# Altium footprint library MOLEX THD.PcbLib: 57 footprints (part 3 of 4)
Each footprint in its own frame and in the unit in brackets; x right, y up, seen from the top. Pads: shape width x height; smd on the part's side, far side on the other; paste and mask are expansions set on the pad; w line width, h text height; cw(c..) or ccw(c..) is an arc to the next point about the centre after c.
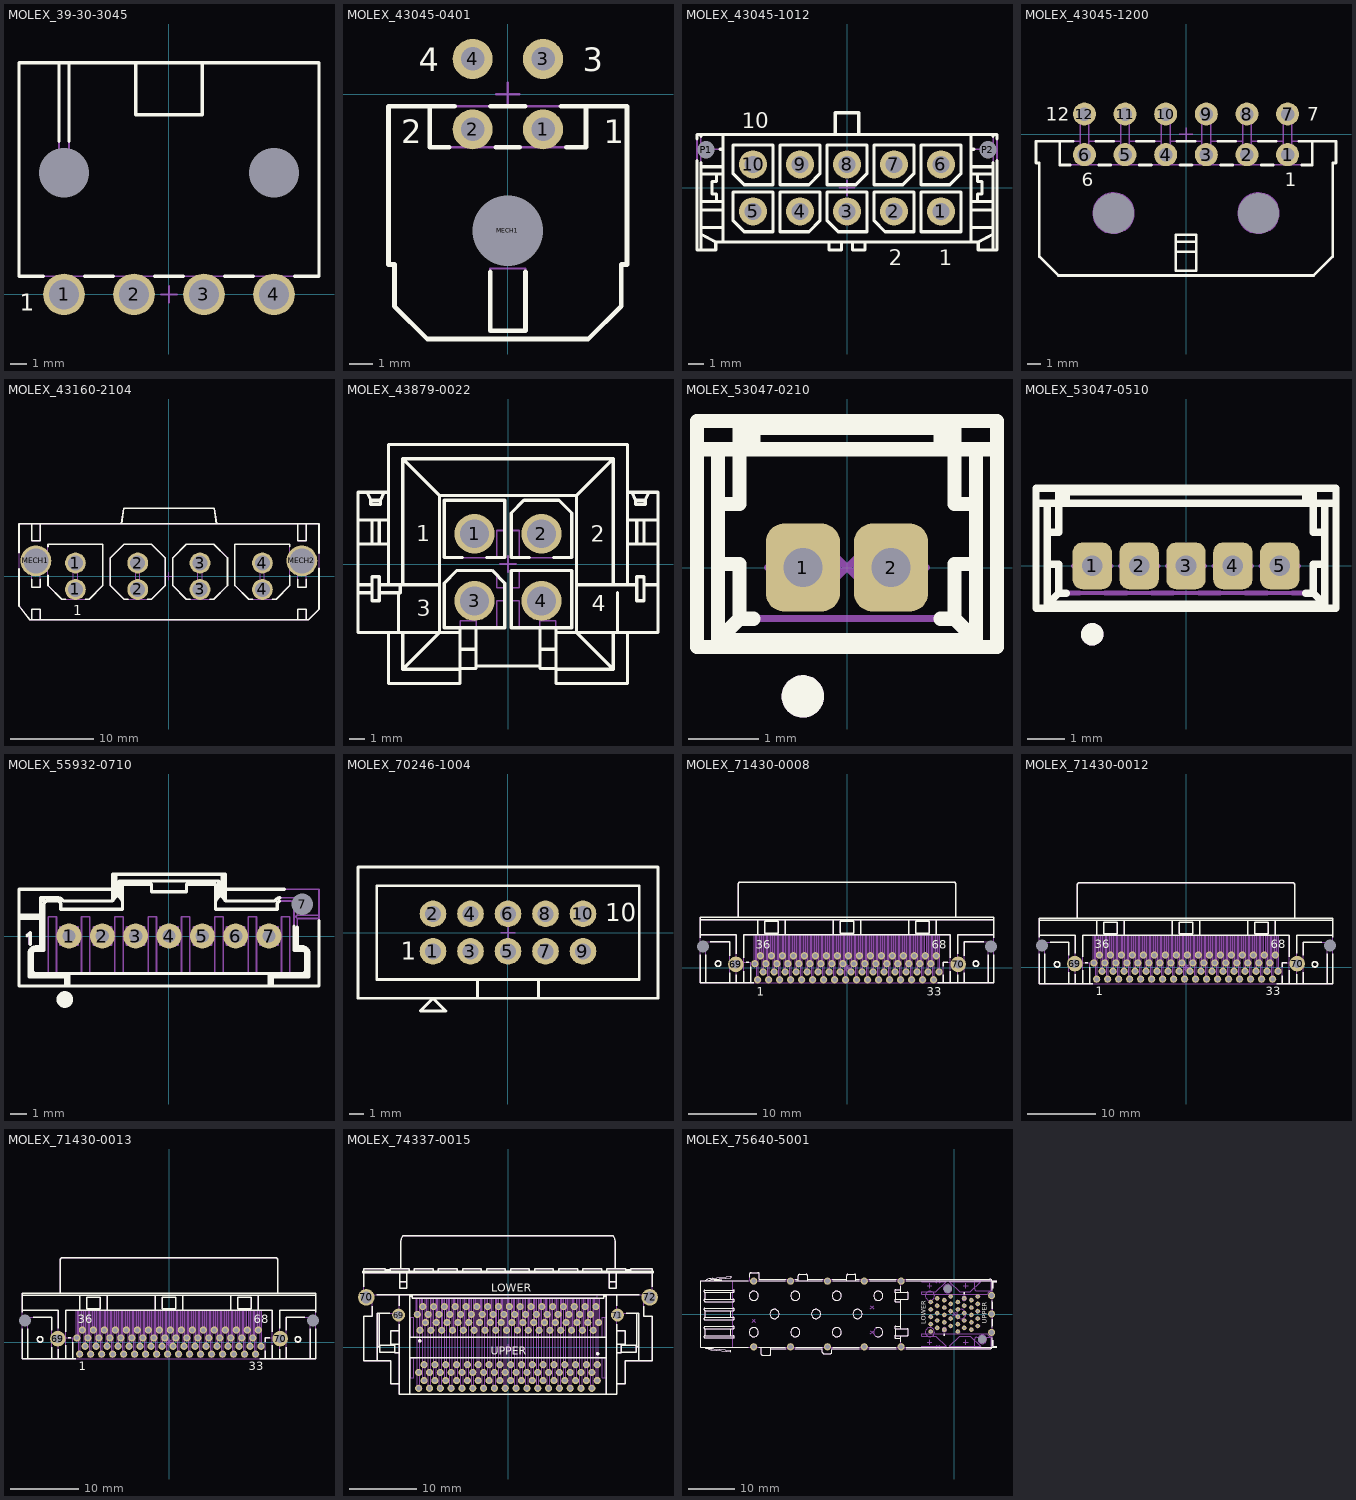
[diagram p2: the footprints below, top view; thin cyan lines are the x and y axes]

## MOLEX_39-30-3045 [mm] "4.20mm (.165\") Pitch Mini-Fit Jr. Header, Single Row, Right Angle, with Snap-in Plastic Peg PCB Lock, 4 Circuits"
height 12.8
pads (6):
  round 2.5 hole 1.8: 1(-6.3,0) 2(-2.1,0) 3(2.1,0) 4(6.3,0)
  round 1 hole 3 unplated mask+1: MECH1(-6.3,7.3) MECH2(6.3,7.3)
Top Overlay:
  lines w0.2: -7.53,1.1 -9,1.1 -9,13.9 9,13.9 9,1.1 7.53,1.1 ; -6.6,9.176 -6.6,13.9 ; -6,9.176 -6,13.9 ; -5.07,1.1 -3.33,1.1 ; -2,13.9 -2,10.778 2,10.778 2,13.9 ; -0.87,1.1 0.87,1.1 ; 3.33,1.1 5.07,1.1
  text "1" at -8.967,-0.968 h1
Mechanical 8:
  lines w0.1: -6.8,0 -6.3,0 ; -6.8,7.3 -6.3,7.3 ; -6.3,-0.5 -6.3,0 ; -6.3,0.5 -6.3,0 ; -6.3,6.8 -6.3,7.3 ; -6.3,7.8 -6.3,7.3 ; -5.8,0 -6.3,0 ; -5.8,7.3 -6.3,7.3 ; -2.6,0 -2.1,0 ; -2.1,-0.5 -2.1,0 ; -2.1,0.5 -2.1,0 ; -1.6,0 -2.1,0 ; -0.5,0 0,0 ; 0,-0.5 0,0 ; 0,0.5 0,0 ; 0.5,0 0,0 ; 1.6,0 2.1,0 ; 2.1,-0.5 2.1,0 ; 2.1,0.5 2.1,0 ; 2.6,0 2.1,0 ; 5.8,0 6.3,0 ; 5.8,7.3 6.3,7.3 ; 6.3,-0.5 6.3,0 ; 6.3,0.5 6.3,0 ; 6.3,6.8 6.3,7.3 ; 6.3,7.8 6.3,7.3 ; 6.8,0 6.3,0 ; 6.8,7.3 6.3,7.3
Mechanical 14:
  lines w0.1: -6.8,1.1 -6.8,-0.5 -5.8,-0.5 -5.8,1.1 ; -6.6,13.9 -6.6,7.6 -6,7.6 -6,13.9 ; -2.6,1.1 -2.6,-0.5 -1.6,-0.5 -1.6,1.1 ; -2,13.9 -2,10.778 2,10.778 2,13.9 ; 1.6,1.1 1.6,-0.5 2.6,-0.5 2.6,1.1 ; 5.8,1.1 5.8,-0.5 6.8,-0.5 6.8,1.1 ; -9,1.1 9,1.1 9,13.9 -9,13.9 -9,1.1
  text "1" at -8.967,-0.968 h1
3D body "MOLEX_39-30-3045.stp": height 7.2, standoff -3.5, extent -9,-0.5 9,13.9

## MOLEX_43045-0401 [mm] "3.00mm (.118\") Pitch Micro-Fit 3.0™ Header, Dual Row, Vertical, with Snap-in Plastic Peg PCB Lock, 4 Circuits"
height 12.8
pads (5):
  round 1.7 hole 1: 1(1.5,-1.5) 2(-1.5,-1.5) 3(1.5,1.5) 4(-1.5,1.5)
  round 1 hole 3 unplated mask+1: MECH1(0,-5.82)
Top Overlay:
  lines w0.2: -3.325,-0.51 -3.325,-2.26 -2.492,-2.26 ; -2.263,-0.51 -5.075,-0.51 -5.075,-7.25 -4.825,-7.25 -4.825,-9.02 -3.425,-10.42 3.425,-10.42 4.825,-9.02 4.825,-7.25 5.075,-7.25 5.075,-0.51 2.263,-0.51 ; -0.75,-7.566 -0.75,-10.07 0.75,-10.07 0.75,-7.566 ; -0.737,-0.51 0.737,-0.51 ; -0.508,-2.26 0.508,-2.26 ; 2.492,-2.26 3.325,-2.26 3.325,-0.51
  text "1" at 4.092,-2.078 h1
  text "3" at 3.192,0.972 h1
  text "4" at -3.783,0.972 h1
  text "2" at -4.533,-2.078 h1
Mechanical 8:
  circle w0.1: c1.5,-1.5 r0.5
  circle w0.1: c1.5,1.5 r0.5
  circle w0.1: c-1.5,1.5 r0.5
  circle w0.1: c-1.5,-1.5 r0.5
  lines w0.1: -2,-1.5 -1.5,-1.5 ; -2,1.5 -1.5,1.5 ; -1.5,-2 -1.5,-1.5 ; -1.5,-1 -1.5,-1.5 ; -1.5,1 -1.5,1.5 ; -1.5,2 -1.5,1.5 ; -1,-1.5 -1.5,-1.5 ; -1,1.5 -1.5,1.5 ; -0.5,-5.82 0,-5.82 ; -0.5,0 0,0 ; 0,-6.32 0,-5.82 ; 0,-5.32 0,-5.82 ; 0,-0.5 0,0 ; 0,0.5 0,0 ; 0.5,-5.82 0,-5.82 ; 0.5,0 0,0 ; 1,-1.5 1.5,-1.5 ; 1,1.5 1.5,1.5 ; 1.5,-2 1.5,-1.5 ; 1.5,-1 1.5,-1.5 ; 1.5,1 1.5,1.5 ; 1.5,2 1.5,1.5 ; 2,-1.5 1.5,-1.5 ; 2,1.5 1.5,1.5
Mechanical 14:
  lines w0.1: -3.325,-0.51 -3.325,-2.26 3.325,-2.26 3.325,-0.51 ; -5.075,-7.25 -5.075,-0.51 5.075,-0.51 5.075,-7.25 4.825,-7.25 4.825,-9.02 3.425,-10.42 -3.425,-10.42 -4.825,-9.02 -4.825,-7.25 -5.075,-7.25 ; -0.75,-10.07 -0.75,-7.42 0.75,-7.42 0.75,-10.07 -0.75,-10.07
  text "1" at 4.092,-2.078 h1
  text "3" at 3.192,0.972 h1
  text "4" at -3.783,0.972 h1
  text "2" at -4.533,-2.078 h1
3D body "MOLEX_43045-0401.stp": height 8.77, standoff -3.18, extent -5.075,-10.42 5.075,1.82

## MOLEX_43045-1012 [mm] "3.00mm (.118\") Pitch Micro-Fit 3.0™ Header, Dual Row, Vertical, with PCB Polarizing Peg, 10 Circuits"
height 9.91
pads (12):
  round 1.8 hole 1.1: 1(6,-1.5) 2(3,-1.5) 3(0,-1.5) 4(-3,-1.5) 5(-6,-1.5) 6(6,1.5) 7(3,1.5) 8(0,1.5) 9(-3,1.5) 10(-6,1.5)
  round 1 hole 1.1 unplated mask+0.05: P1(-9,2.44) P2(9,2.44)
Top Overlay:
  lines w0.2: -9.575,1.748 -9.575,-3.97 -8.375,-3.97 -8.375,-3.46 ; -9.575,3.132 -9.575,3.4 9.575,3.4 9.575,3.132 ; -9.325,-3.97 -9.325,1.601 ; -9.325,-2.96 -8.375,-3.46 ; -9.325,-2.53 -7.925,-2.53 -7.925,-1.405 -9.325,-1.405 ; -9.325,-0.875 -7.925,-0.875 ; -9.325,0.875 -7.925,0.875 ; -9.325,1.345 -7.925,1.345 ; -9.325,3.279 -9.325,3.4 ; -8.325,-0.875 -8.325,-0.4 -8.625,-0.4 -8.625,0.4 -8.325,0.4 -8.325,0.875 ; -8.101,2.47 -7.925,2.47 ; -7.925,-3.46 -7.925,3.4 ; -1.15,-3.46 -1.15,-3.97 -0.35,-3.97 -0.35,-3.46 ; -0.75,3.4 -0.75,4.8 0.75,4.8 0.75,3.4 ; 0.35,-3.46 0.35,-3.97 1.15,-3.97 1.15,-3.46 ; 7.925,-3.46 7.925,3.4 ; 7.925,-2.53 9.325,-2.53 ; 7.925,-1.405 9.325,-1.405 ; 7.925,-0.875 9.325,-0.875 ; 7.925,0.875 9.325,0.875 ; 7.925,1.345 9.325,1.345 ; 7.925,2.47 8.101,2.47 ; 8.325,-0.875 8.325,-0.4 8.625,-0.4 8.625,0.4 8.325,0.4 8.325,0.875 ; 9.325,-3.97 9.325,1.601 ; 9.325,-2.96 8.375,-3.46 ; 9.325,3.279 9.325,3.4 ; 9.575,1.748 9.575,-3.97 8.375,-3.97 8.375,-3.46 ; -8.375,-3.46 8.375,-3.46 ; -7.27,-2.1 -6.57,-2.8 -4.73,-2.8 -4.73,-0.26 -7.27,-0.26 -7.27,-2.1 ; -7.27,0.9 -6.57,0.2 -4.73,0.2 -4.73,2.74 -7.27,2.74 -7.27,0.9 ; -4.27,-2.8 -2.43,-2.8 -1.73,-2.1 -1.73,-0.26 -4.27,-0.26 -4.27,-2.8 ; -4.27,0.2 -2.43,0.2 -1.73,0.9 -1.73,2.74 -4.27,2.74 -4.27,0.2 ; -1.27,-2.1 -0.57,-2.8 1.27,-2.8 1.27,-0.26 -1.27,-0.26 -1.27,-2.1 ; -1.27,0.2 0.57,0.2 1.27,0.9 1.27,2.74 -1.27,2.74 -1.27,0.2 ; 1.73,-2.1 2.43,-2.8 4.27,-2.8 4.27,-0.26 1.73,-0.26 1.73,-2.1 ; 1.73,0.2 3.57,0.2 4.27,0.9 4.27,2.74 1.73,2.74 1.73,0.2 ; 4.73,-2.8 7.27,-2.8 7.27,-0.26 4.73,-0.26 4.73,-2.8 ; 4.73,0.2 4.73,2.74 7.27,2.74 7.27,0.9 6.57,0.2 4.73,0.2
  text "10" at -6.731,3.81 h1
  text "1" at 5.842,-4.953 h1
  text "2" at 2.667,-4.953 h1
Mechanical 8:
  lines w0.1: -9.5,2.44 -9,2.44 ; -9,1.94 -9,2.44 ; -9,2.94 -9,2.44 ; -8.5,2.44 -9,2.44 ; -6.5,-1.5 -6,-1.5 ; -6.5,1.5 -6,1.5 ; -6,-2 -6,-1.5 ; -6,-1 -6,-1.5 ; -6,1 -6,1.5 ; -6,2 -6,1.5 ; -5.5,-1.5 -6,-1.5 ; -5.5,1.5 -6,1.5 ; -3.5,-1.5 -3,-1.5 ; -3.5,1.5 -3,1.5 ; -3,-2 -3,-1.5 ; -3,-1 -3,-1.5 ; -3,1 -3,1.5 ; -3,2 -3,1.5 ; -2.5,-1.5 -3,-1.5 ; -2.5,1.5 -3,1.5 ; -0.5,-1.5 0,-1.5 ; -0.5,0 0,0 ; -0.5,1.5 0,1.5 ; 0,-2 0,-1.5 ; 0,-1 0,-1.5 ; 0,-0.5 0,0 ; 0,0.5 0,0 ; 0,1 0,1.5 ; 0,2 0,1.5 ; 0.5,-1.5 0,-1.5 ; 0.5,0 0,0 ; 0.5,1.5 0,1.5 ; 2.5,-1.5 3,-1.5 ; 2.5,1.5 3,1.5 ; 3,-2 3,-1.5 ; 3,-1 3,-1.5 ; 3,1 3,1.5 ; 3,2 3,1.5 ; 3.5,-1.5 3,-1.5 ; 3.5,1.5 3,1.5 ; 5.5,-1.5 6,-1.5 ; 5.5,1.5 6,1.5 ; 6,-2 6,-1.5 ; 6,-1 6,-1.5 ; 6,1 6,1.5 ; 6,2 6,1.5 ; 6.5,-1.5 6,-1.5 ; 6.5,1.5 6,1.5 ; 8.5,2.44 9,2.44 ; 9,1.94 9,2.44 ; 9,2.94 9,2.44 ; 9.5,2.44 9,2.44
Mechanical 14:
  lines w0.1: -9.325,-3.97 -9.325,3.4 ; -9.325,-2.96 -8.375,-3.46 ; -9.325,-2.53 -7.925,-2.53 -7.925,-1.405 -9.325,-1.405 ; -9.325,-0.875 -7.925,-0.875 ; -9.325,0.875 -7.925,0.875 ; -9.325,1.345 -7.925,1.345 ; -9.325,2.47 -7.925,2.47 ; -8.325,-0.875 -8.325,-0.4 -8.625,-0.4 -8.625,0.4 -8.325,0.4 -8.325,0.875 ; -7.925,-3.46 -7.925,3.4 ; -1.15,-3.46 -1.15,-3.97 -0.35,-3.97 -0.35,-3.46 ; -0.75,3.4 -0.75,4.8 0.75,4.8 0.75,3.4 ; 0.35,-3.46 0.35,-3.97 1.15,-3.97 1.15,-3.46 ; 7.925,-3.46 7.925,3.4 ; 7.925,-2.53 9.325,-2.53 ; 7.925,-1.405 9.325,-1.405 ; 7.925,-0.875 9.325,-0.875 ; 7.925,0.875 9.325,0.875 ; 7.925,1.345 9.325,1.345 ; 7.925,2.47 9.325,2.47 ; 8.325,-0.875 8.325,-0.4 8.625,-0.4 8.625,0.4 8.325,0.4 8.325,0.875 ; 9.325,-3.97 9.325,3.4 ; 9.325,-2.96 8.375,-3.46 ; -8.375,-3.46 -8.375,-3.97 -9.575,-3.97 -9.575,3.4 9.575,3.4 9.575,-3.97 8.375,-3.97 8.375,-3.46 ; -8.375,-3.46 8.375,-3.46 ; -7.27,-2.1 -7.27,-0.26 -4.73,-0.26 -4.73,-2.8 -6.57,-2.8 -7.27,-2.1 ; -7.27,0.9 -7.27,2.74 -4.73,2.74 -4.73,0.2 -6.57,0.2 -7.27,0.9 ; -4.27,-2.8 -4.27,-0.26 -1.73,-0.26 -1.73,-2.1 -2.43,-2.8 -4.27,-2.8 ; -4.27,0.2 -4.27,2.74 -1.73,2.74 -1.73,0.9 -2.43,0.2 -4.27,0.2 ; -1.27,-2.1 -1.27,-0.26 1.27,-0.26 1.27,-2.8 -0.57,-2.8 -1.27,-2.1 ; -1.27,0.2 -1.27,2.74 1.27,2.74 1.27,0.9 0.57,0.2 -1.27,0.2 ; 1.73,-2.1 1.73,-0.26 4.27,-0.26 4.27,-2.8 2.43,-2.8 1.73,-2.1 ; 1.73,0.2 1.73,2.74 4.27,2.74 4.27,0.9 3.57,0.2 1.73,0.2 ; 4.73,-2.8 4.73,-0.26 7.27,-0.26 7.27,-2.8 4.73,-2.8 ; 4.73,0.2 6.57,0.2 7.27,0.9 7.27,2.74 4.73,2.74 4.73,0.2
  text "1" at 5.842,-4.953 h1
  text "10" at -6.731,3.81 h1
  text "2" at 2.667,-4.953 h1
3D body "MOLEX_43045-1012.stp": height 9.91, standoff -3.18, extent -9.575,-3.97 9.575,4.8

## MOLEX_43045-1200 [mm] "3.00mm (.118\") Pitch Micro-Fit 3.0™, Dual Row Righ Angled Header, with PCB Polarizing Peg, 12 Circuits"
height 8.77
pads (14):
  round 1.7 hole 1: 1(7.5,-1.5) 2(4.5,-1.5) 3(1.5,-1.5) 4(-1.5,-1.5) 5(-4.5,-1.5) 6(-7.5,-1.5) 7(7.5,1.5) 8(4.5,1.5) 9(1.5,1.5) 10(-1.5,1.5) 11(-4.5,1.5) 12(-7.5,1.5)
  round 1 hole 3 unplated mask+1: MECH1(-5.35,-5.82) MECH2(5.35,-5.82)
Top Overlay:
  lines w0.2: -9.325,-0.51 -9.325,-2.26 -8.555,-2.26 ; -8.343,-0.51 -11.075,-0.51 -11.075,-2.11 -10.825,-2.11 -10.825,-9.02 -9.425,-10.42 9.425,-10.42 10.825,-9.02 10.825,-2.11 11.075,-2.11 11.075,-0.51 8.343,-0.51 ; -6.657,-0.51 -5.343,-0.51 ; -6.445,-2.26 -5.555,-2.26 ; -3.657,-0.51 -2.343,-0.51 ; -3.445,-2.26 -2.555,-2.26 ; -0.75,-8.67 0.75,-8.67 ; -0.75,-7.92 0.75,-7.92 ; -0.657,-0.51 0.657,-0.51 ; -0.445,-2.26 0.445,-2.26 ; 2.343,-0.51 3.657,-0.51 ; 2.555,-2.26 3.445,-2.26 ; 5.343,-0.51 6.657,-0.51 ; 5.555,-2.26 6.445,-2.26 ; 8.555,-2.26 9.325,-2.26 9.325,-0.51 ; -0.75,-10.07 0.75,-10.07 0.75,-7.42 -0.75,-7.42 -0.75,-10.07
  text "1" at 7.292,-3.828 h1
  text "7" at 8.942,1.022 h1
  text "12" at -10.358,1.022 h1
  text "6" at -7.708,-3.828 h1
Mechanical 8:
  circle w0.1: c-5.35,-5.82 r1.5
  circle w0.1: c5.35,-5.82 r1.5
  lines w0.1: -8,-1.5 -7.5,-1.5 ; -8,1.5 -7.5,1.5 ; -7.5,-2 -7.5,-1.5 ; -7.5,-1 -7.5,-1.5 ; -7.5,1 -7.5,1.5 ; -7.5,2 -7.5,1.5 ; -7,-1.5 -7.5,-1.5 ; -7,1.5 -7.5,1.5 ; -5.85,-5.82 -5.35,-5.82 ; -5.35,-6.32 -5.35,-5.82 ; -5.35,-5.32 -5.35,-5.82 ; -5,-1.5 -4.5,-1.5 ; -5,1.5 -4.5,1.5 ; -4.85,-5.82 -5.35,-5.82 ; -4.5,-2 -4.5,-1.5 ; -4.5,-1 -4.5,-1.5 ; -4.5,1 -4.5,1.5 ; -4.5,2 -4.5,1.5 ; -4,-1.5 -4.5,-1.5 ; -4,1.5 -4.5,1.5 ; -2,-1.5 -1.5,-1.5 ; -2,1.5 -1.5,1.5 ; -1.5,-2 -1.5,-1.5 ; -1.5,-1 -1.5,-1.5 ; -1.5,1 -1.5,1.5 ; -1.5,2 -1.5,1.5 ; -1,-1.5 -1.5,-1.5 ; -1,1.5 -1.5,1.5 ; -0.5,0 0,0 ; 0,-0.5 0,0 ; 0,0.5 0,0 ; 0.5,0 0,0 ; 1,-1.5 1.5,-1.5 ; 1,1.5 1.5,1.5 ; 1.5,-2 1.5,-1.5 ; 1.5,-1 1.5,-1.5 ; 1.5,1 1.5,1.5 ; 1.5,2 1.5,1.5 ; 2,-1.5 1.5,-1.5 ; 2,1.5 1.5,1.5 ; 4,-1.5 4.5,-1.5 ; 4,1.5 4.5,1.5 ; 4.5,-2 4.5,-1.5 ; 4.5,-1 4.5,-1.5 ; 4.5,1 4.5,1.5 ; 4.5,2 4.5,1.5 ; 4.85,-5.82 5.35,-5.82 ; 5,-1.5 4.5,-1.5 ; 5,1.5 4.5,1.5 ; 5.35,-6.32 5.35,-5.82 ; 5.35,-5.32 5.35,-5.82 ; 5.85,-5.82 5.35,-5.82 ; 7,-1.5 7.5,-1.5 ; 7,1.5 7.5,1.5 ; 7.5,-2 7.5,-1.5 ; 7.5,-1 7.5,-1.5 ; 7.5,1 7.5,1.5 ; 7.5,2 7.5,1.5 ; 8,-1.5 7.5,-1.5 ; 8,1.5 7.5,1.5
Mechanical 14:
  lines w0.1: -9.325,-0.51 -9.325,-2.26 9.325,-2.26 9.325,-0.51 ; -7.82,-0.51 -11.075,-0.51 -11.075,-2.11 -10.825,-2.11 -10.825,-9.02 -9.425,-10.42 9.425,-10.42 10.825,-9.02 10.825,-2.11 11.075,-2.11 11.075,-0.51 7.82,-0.51 ; -7.18,-0.51 -4.82,-0.51 ; -4.18,-0.51 -1.82,-0.51 ; -1.18,-0.51 1.18,-0.51 ; -0.75,-8.67 0.75,-8.67 ; -0.75,-7.92 0.75,-7.92 ; 1.82,-0.51 4.18,-0.51 ; 4.82,-0.51 7.18,-0.51 ; -7.82,-1.82 -7.82,1.82 -7.18,1.82 -7.18,-1.82 -7.82,-1.82 ; -4.82,-1.82 -4.82,1.82 -4.18,1.82 -4.18,-1.82 -4.82,-1.82 ; -1.82,-1.82 -1.82,1.82 -1.18,1.82 -1.18,-1.82 -1.82,-1.82 ; -0.75,-10.07 0.75,-10.07 0.75,-7.42 -0.75,-7.42 -0.75,-10.07 ; 1.18,-1.82 1.18,1.82 1.82,1.82 1.82,-1.82 1.18,-1.82 ; 4.18,-1.82 4.18,1.82 4.82,1.82 4.82,-1.82 4.18,-1.82 ; 7.18,-1.82 7.18,1.82 7.82,1.82 7.82,-1.82 7.18,-1.82
  text "1" at 7.292,-3.828 h1
  text "7" at 8.942,1.022 h1
  text "12" at -10.358,1.022 h1
  text "6" at -7.708,-3.828 h1
3D body "MOLEX_43045-1200.stp": height 8.77, standoff -3.18, extent -11.075,-10.42 11.075,1.82

## MOLEX_43160-2104 [mm] "7.50mm Pitch  4 Circuits Sabre™ Vertical Header  (Glow Wire Compatible) with Board Lock"
height 14.86
pads (10):
  round 2.5 hole 1.8: 1(-11.24,-1.59) 1(-11.24,1.59) 2(-3.747,-1.59) 2(-3.747,1.59) 3(3.747,-1.59) 3(3.747,1.59) 4(11.24,-1.59) 4(11.24,1.59)
  round 3.7 hole 3: MECH1(-15.989,1.844) MECH2(15.989,1.844)
Top Overlay:
  lines w0.2: -18.021,0.879 -18.021,-3.569 -16.751,-5.22 16.777,-5.22 18.047,-3.95 18.047,0.933 ; -18.021,2.808 -18.021,6.312 18.047,6.312 18.047,2.755 ; -16.485,-5.22 -16.485,-3.95 -15.469,-3.95 -15.469,-5.22 ; -16.485,-0.351 -16.485,-1.308 -15.481,-1.308 -15.481,-0.348 ; -16.485,6.312 -16.485,4.28 -15.469,4.28 -15.469,6.312 ; -14.542,0.121 -14.542,-1.105 -12.891,-2.756 -12.407,-2.756 ; -14.542,3.567 -14.542,3.848 -7.938,3.848 -7.938,-1.105 -9.589,-2.756 -10.072,-2.756 ; -5.702,6.312 -5.437,8.166 5.462,8.166 5.728,6.312 ; -4.914,-2.756 -5.398,-2.756 -7.049,-1.105 -7.049,2.197 -5.398,3.848 -2.095,3.848 -0.445,2.197 -0.445,-1.105 -2.095,-2.756 -2.579,-2.756 ; 2.579,-2.756 2.095,-2.756 0.445,-1.105 0.445,2.197 2.095,3.848 5.398,3.848 7.049,2.197 7.049,-1.105 5.398,-2.756 4.914,-2.756 ; 10.072,-2.756 9.589,-2.756 7.938,-1.105 7.938,3.848 14.542,3.848 14.542,3.566 ; 12.407,-2.756 12.891,-2.756 14.542,-1.105 14.542,0.122 ; 15.494,-5.22 15.494,-3.95 16.51,-3.95 16.51,-5.22 ; 15.494,-0.351 15.494,-1.308 16.51,-1.308 16.51,-0.345 ; 15.494,6.312 15.494,4.28 16.51,4.28 16.51,6.312
  text "1" at -11.5,-4.7 h1.2
Mechanical 8:
  lines w0.1: -16.489,1.844 -15.989,1.844 ; -15.989,1.344 -15.989,1.844 ; -15.989,2.344 -15.989,1.844 ; -15.489,1.844 -15.989,1.844 ; -11.74,-1.59 -11.24,-1.59 ; -11.74,1.59 -11.24,1.59 ; -11.24,-2.09 -11.24,-1.59 ; -11.24,-1.09 -11.24,-1.59 ; -11.24,1.09 -11.24,1.59 ; -11.24,2.09 -11.24,1.59 ; -10.74,-1.59 -11.24,-1.59 ; -10.74,1.59 -11.24,1.59 ; -4.247,-1.59 -3.747,-1.59 ; -4.247,1.59 -3.747,1.59 ; -3.747,-2.09 -3.747,-1.59 ; -3.747,-1.09 -3.747,-1.59 ; -3.747,1.09 -3.747,1.59 ; -3.747,2.09 -3.747,1.59 ; -3.247,-1.59 -3.747,-1.59 ; -3.247,1.59 -3.747,1.59 ; -0.5,0 0,0 ; 0,-0.5 0,0 ; 0,0.5 0,0 ; 0.5,0 0,0 ; 3.247,-1.59 3.747,-1.59 ; 3.247,1.59 3.747,1.59 ; 3.747,-2.09 3.747,-1.59 ; 3.747,-1.09 3.747,-1.59 ; 3.747,1.09 3.747,1.59 ; 3.747,2.09 3.747,1.59 ; 4.247,-1.59 3.747,-1.59 ; 4.247,1.59 3.747,1.59 ; 10.74,-1.59 11.24,-1.59 ; 10.74,1.59 11.24,1.59 ; 11.24,-2.09 11.24,-1.59 ; 11.24,-1.09 11.24,-1.59 ; 11.24,1.09 11.24,1.59 ; 11.24,2.09 11.24,1.59 ; 11.74,-1.59 11.24,-1.59 ; 11.74,1.59 11.24,1.59 ; 15.489,1.844 15.989,1.844 ; 15.989,1.344 15.989,1.844 ; 15.989,2.344 15.989,1.844 ; 16.489,1.844 15.989,1.844
Mechanical 14:
  lines w0.1: -16.485,-5.22 -16.485,-3.95 -15.469,-3.95 -15.469,-5.22 ; -16.485,6.312 -16.485,4.28 -15.469,4.28 -15.469,6.312 ; -5.702,6.312 -5.437,8.166 5.462,8.166 5.728,6.312 ; 15.494,-5.22 15.494,-3.95 16.51,-3.95 16.51,-5.22 ; 15.494,6.312 15.494,4.28 16.51,4.28 16.51,6.312 ; -18.021,-3.569 -16.751,-5.22 16.777,-5.22 18.047,-3.95 18.047,6.312 -18.021,6.312 -18.021,-3.569 ; -16.485,-1.308 -15.481,-1.308 -15.481,1.232 -16.485,1.232 -16.485,-1.308 ; -14.542,-1.105 -12.891,-2.756 -9.589,-2.756 -7.938,-1.105 -7.938,3.848 -14.542,3.848 -14.542,-1.105 ; -11.494,-1.041 -10.986,-1.041 -10.986,2.134 -11.494,2.134 -11.494,-1.041 ; -7.049,-1.105 -5.398,-2.756 -2.095,-2.756 -0.445,-1.105 -0.445,2.197 -2.095,3.848 -5.398,3.848 -7.049,2.197 -7.049,-1.105 ; -4.001,-1.041 -3.493,-1.041 -3.493,2.134 -4.001,2.134 -4.001,-1.041 ; 0.445,-1.105 2.095,-2.756 5.398,-2.756 7.049,-1.105 7.049,2.197 5.398,3.848 2.095,3.848 0.445,2.197 0.445,-1.105 ; 3.493,-1.041 4.001,-1.041 4.001,2.134 3.493,2.134 3.493,-1.041 ; 7.938,-1.105 9.589,-2.756 12.891,-2.756 14.542,-1.105 14.542,3.848 7.938,3.848 7.938,-1.105 ; 10.986,-1.041 11.494,-1.041 11.494,2.134 10.986,2.134 10.986,-1.041 ; 15.494,-1.308 16.51,-1.308 16.51,1.232 15.494,1.232 15.494,-1.308
  text "1" at -11.5,-4.7 h1.2
3D body "MOLEX_43160-2104.stp": height 14.76, standoff -3.81, extent -18.021,-5.22 18.047,8.166

## MOLEX_43879-0022 [mm] "4.20mm Pitch, Mini-Fit® CPI (Compliant Pin Interface) 4 Circuits Dual Row Vertical Header"
height 14.9
pads (4):
  round 2.5 hole 1.8: 1(-2.1,1.9) 2(2.1,1.9) 3(-2.1,-2.314) 4(2.1,-2.314)
Top Overlay:
  lines w0.2: -9.405,-1.8 -8.525,-1.8 ; -9.405,-1.3 -8.525,-1.3 ; -9.405,1.25 -7.5,1.25 ; -9.405,2.75 -7.5,2.75 ; -8.833,4.5 -8.6,4.001 ; -8.525,1.25 -8.525,2.75 ; -8.075,-1.8 -6.755,-1.8 -6.755,-1.3 ; -8.075,-1.3 -4.3,-1.3 ; -8.075,1.25 -8.075,2.75 ; -7.767,4.5 -8,4.001 ; -7.5,-4.3 -7.5,-7.5 -3,-7.5 -3,-4 ; -7.5,-1.3 -7.5,7.5 7.5,7.5 7.5,-1.3 ; -7.5,4.5 -9.405,4.5 -9.405,-4.3 -3,-4.3 ; -6.86,-4.3 -6.86,-1.8 ; -6.6,-4.3 -6.6,-6.6 ; -6.6,-1.3 -6.6,6.6 ; -3,-6.6 -6.6,-6.6 ; -3,-6.55 -2,-6.55 -2,-4 ; -3,-5.35 -2,-5.35 ; -2.845,0.4 -4,0.4 -4,4 -0.2,4 -0.2,0.4 -1.355,0.4 ; -2,-6.4 2,-6.4 ; 1.355,0.4 0.2,0.4 0.2,3.2 1,4 3.2,4 4,3.2 4,0.4 2.845,0.4 ; 2,-5.35 3,-5.35 ; 2,-3.986 2,-6.55 3,-6.55 ; 3,-6.6 6.6,-6.6 ; 3,-4.3 9.405,-4.3 9.405,4.5 7.5,4.5 ; 3,-4 3,-7.5 7.5,-7.5 7.5,-4.3 ; 4.3,-1.3 8.075,-1.3 ; 6.6,-4.3 6.6,-6.6 ; 6.6,-1.3 6.6,6.6 ; 6.86,-4.3 6.86,-1.8 ; 7.5,1.25 9.405,1.25 ; 7.5,2.75 9.405,2.75 ; 7.767,4.5 8,4.001 ; 8.075,1.25 8.075,2.75 ; 8.525,-1.3 9.405,-1.3 ; 8.525,1.25 8.525,2.75 ; 8.833,4.5 8.6,4 ; -8.6,4.001 -8.6,3.75 -8,3.75 -8,4.001 ; -8.6,4.001 -8,4.001 ; -6.6,-6.6 -4.3,-4.3 -4.3,4.3 ; -6.6,6.6 6.6,6.6 ; -6.6,6.6 -4.3,4.3 ; -4.3,4.3 4.3,4.3 ; 4.3,4.3 4.3,-4.3 6.6,-6.6 ; 4.3,4.3 6.6,6.6 ; 8,4.001 8,3.75 8.6,3.75 8.6,4.001 ; 8,4.001 8.6,4 ; -8.525,-2.3 -8.525,-0.8 -8.075,-0.8 -8.075,-2.3 -8.525,-2.3 ; -4,-4 -0.2,-4 -0.2,-1.2 -1,-0.4 -3.2,-0.4 -4,-1.2 -4,-4 ; 0.2,-4 0.2,-0.4 4,-0.4 4,-4 0.2,-4 ; 8.075,-2.3 8.075,-0.8 8.525,-0.8 8.525,-2.3 8.075,-2.3
  text "3" at -5.733,-3.289 h1
  text "2" at 5.192,1.386 h1
  text "4" at 5.242,-2.975 h1
  text "1" at -5.767,1.432 h1
Mechanical 8:
  lines w0.1: -2.6,-2.314 -2.1,-2.314 ; -2.6,1.9 -2.1,1.9 ; -2.1,-2.814 -2.1,-2.314 ; -2.1,-1.814 -2.1,-2.314 ; -2.1,1.4 -2.1,1.9 ; -2.1,2.4 -2.1,1.9 ; -1.6,-2.314 -2.1,-2.314 ; -1.6,1.9 -2.1,1.9 ; -0.5,0 0,0 ; 0,-0.5 0,0 ; 0,0.5 0,0 ; 0.5,0 0,0 ; 1.6,-2.314 2.1,-2.314 ; 1.6,1.9 2.1,1.9 ; 2.1,-2.814 2.1,-2.314 ; 2.1,-1.814 2.1,-2.314 ; 2.1,1.4 2.1,1.9 ; 2.1,2.4 2.1,1.9 ; 2.6,-2.314 2.1,-2.314 ; 2.6,1.9 2.1,1.9
Mechanical 14:
  lines w0.1: -9.405,-1.8 -8.525,-1.8 ; -9.405,-1.3 -8.525,-1.3 ; -9.405,1.25 -7.5,1.25 ; -9.405,2.75 -7.5,2.75 ; -8.833,4.5 -8.6,4.001 ; -8.525,1.25 -8.525,2.75 ; -8.075,-1.8 -6.755,-1.8 -6.755,-1.3 ; -8.075,-1.3 -4.3,-1.3 ; -8.075,1.25 -8.075,2.75 ; -7.767,4.5 -8,4.001 ; -7.5,-4.3 -7.5,-7.5 -3,-7.5 -3,-3.55 -2,-3.55 -2,-6.55 -3,-6.55 ; -7.5,-1.3 -7.5,7.5 7.5,7.5 7.5,-1.3 ; -7.5,4.5 -9.405,4.5 -9.405,-4.3 -3,-4.3 ; -6.86,-4.3 -6.86,-1.8 ; -6.6,-4.3 -6.6,-6.6 ; -6.6,-1.3 -6.6,6.6 ; -3,-6.6 -6.6,-6.6 ; -3,-5.35 -2,-5.35 ; -2,-6.4 2,-6.4 ; -0.7,-4 -0.7,-2.3 -0.2,-2.3 ; -0.7,-0.7 -0.7,-1.5 -0.2,-1.5 ; -0.7,0.4 -0.7,2.1 -0.2,2.1 ; 0.2,-3.96 0.7,-3.96 0.7,-2.3 0.2,-2.3 ; 0.2,-1.5 0.7,-1.5 0.7,-0.4 ; 0.2,2.1 0.7,2.1 0.7,0.4 ; 2,-5.35 3,-5.35 ; 3,-6.6 6.6,-6.6 ; 3,-6.55 2,-6.55 2,-3.55 3,-3.55 3,-7.5 7.5,-7.5 7.5,-4.3 ; 3,-4.3 9.405,-4.3 9.405,4.5 7.5,4.5 ; 4.3,-1.3 8.075,-1.3 ; 6.6,-4.3 6.6,-6.6 ; 6.6,-1.3 6.6,6.6 ; 6.86,-4.3 6.86,-1.8 ; 7.5,1.25 9.405,1.25 ; 7.5,2.75 9.405,2.75 ; 7.767,4.5 8,4.001 ; 8.075,1.25 8.075,2.75 ; 8.525,-1.3 9.405,-1.3 ; 8.525,1.25 8.525,2.75 ; 8.833,4.5 8.6,4 ; -8.6,4.001 -8.6,3.75 -8,3.75 -8,4.001 ; -8.6,4.001 -8,4.001 ; -6.6,-6.6 -4.3,-4.3 -4.3,4.3 ; -6.6,6.6 6.6,6.6 ; -6.6,6.6 -4.3,4.3 ; -4.3,4.3 4.3,4.3 ; 4.3,4.3 4.3,-4.3 6.6,-6.6 ; 4.3,4.3 6.6,6.6 ; 8,4.001 8,3.75 8.6,3.75 8.6,4.001 ; 8,4.001 8.6,4 ; -8.525,-2.3 -8.525,-0.8 -8.075,-0.8 -8.075,-2.3 -8.525,-2.3 ; -4,-4 -0.2,-4 -0.2,-1.2 -1,-0.4 -3.2,-0.4 -4,-1.2 -4,-4 ; -4,0.4 -4,4 -0.2,4 -0.2,0.4 -4,0.4 ; -2.475,-2.675 -2.475,-1.925 -1.725,-1.925 -1.725,-2.675 -2.475,-2.675 ; -2.475,1.525 -2.475,2.275 -1.725,2.275 -1.725,1.525 -2.475,1.525 ; 0.2,-4 0.2,-0.4 4,-0.4 4,-4 0.2,-4 ; 0.2,0.4 4,0.4 4,3.2 3.2,4 1,4 0.2,3.2 0.2,0.4 ; 1.725,-2.675 1.725,-1.925 2.475,-1.925 2.475,-2.675 1.725,-2.675 ; 1.725,1.525 1.725,2.275 2.475,2.275 2.475,1.525 1.725,1.525 ; 8.075,-2.3 8.075,-0.8 8.525,-0.8 8.525,-2.3 8.075,-2.3
  text "3" at -5.733,-3.289 h1
  text "2" at 5.192,1.386 h1
  text "4" at 5.242,-2.975 h1
  text "1" at -5.767,1.432 h1
Drill Drawing:
  lines w0.1: -4,-4 4,-4 4,4 -4,4 -4,-4
  text "diam. 1.8mm +0.1 -0.05" at -8.9,4.4 h1
  text "PRESS-FIT TECHNOLOGY" at -8.275,6.075 h1
3D body "MOLEX_43879-0022.stp": height 14.9, standoff -5.82, extent -9.405,-7.5 9.405,7.5
